# Altium footprint library Connectors THD.PcbLib: 631 footprints (part 1 of 46) (continued)
## 3M_2540-6002RB [mm] "40 Contacts - Straight .100\" x .100\" Low Profile Four-Wall Header"
height 10.03
pads (40):
  round 1.6 hole 1: 1(-24.13,-1.27) 2(-24.13,1.27) 3(-21.59,-1.27) 4(-21.59,1.27) 5(-19.05,-1.27) 6(-19.05,1.27) 7(-16.51,-1.27) 8(-16.51,1.27) 9(-13.97,-1.27) 10(-13.97,1.27) 11(-11.43,-1.27) 12(-11.43,1.27) 13(-8.89,-1.27) 14(-8.89,1.27) 15(-6.35,-1.27) 16(-6.35,1.27) 17(-3.81,-1.27) 18(-3.81,1.27) 19(-1.27,-1.27) 20(-1.27,1.27) 21(1.27,-1.27) 22(1.27,1.27) 23(3.81,-1.27) 24(3.81,1.27) 25(6.35,-1.27) 26(6.35,1.27) 27(8.89,-1.27) 28(8.89,1.27) 29(11.43,-1.27) 30(11.43,1.27) 31(13.97,-1.27) 32(13.97,1.27) 33(16.51,-1.27) 34(16.51,1.27) 35(19.05,-1.27) 36(19.05,1.27) 37(21.59,-1.27) 38(21.59,1.27) 39(24.13,-1.27) 40(24.13,1.27)
Top Overlay:
  circle w0.3: c-24.13,-4.699 r0.15
  lines w0.2: -28.042,-1.603 -25.629,-1.603 -25.629,1.603 -28.042,1.603 ; -28.042,-1.524 -28.346,-1.524 -28.346,1.524 -28.042,1.524 ; -24.994,-4.064 -24.13,-3.2 -23.266,-4.064 ; -23.178,3.15 -28.042,3.15 -28.042,-3.2 -3.366,-3.2 ; -23.178,4.064 -23.178,2.159 -22.469,2.159 ; -21.361,-3.835 -21.361,-3.2 ; -19.279,-3.835 -19.279,-3.2 ; -18.987,2.518 -18.987,4.064 ; -18.987,3.15 18.987,3.15 ; -3.366,-4.064 -3.366,-2.438 ; 0.826,-4.064 0.826,-2.438 ; 0.826,-3.2 28.042,-3.2 28.042,3.15 25.4,3.15 ; 18.987,2.518 18.987,4.064 ; 21.819,-3.835 21.819,-3.2 ; 22.469,2.159 23.178,2.159 23.178,4.064 ; 23.901,-3.835 23.901,-3.2 ; 28.042,-1.603 25.629,-1.603 25.629,1.603 28.042,1.603 ; 28.042,-1.524 28.346,-1.524 28.346,1.524 28.042,1.524 ; -29.058,-4.064 -29.058,4.064 -28.397,4.064 cw(c-27.94,4.064) -27.483,4.064 -1.727,4.064 cw(c-1.27,4.064) -0.813,4.064 27.483,4.064 cw(c27.94,4.064) 28.397,4.064 29.058,4.064 29.058,-4.064 24.892,-4.064 24.892,-3.835 20.828,-3.835 20.828,-4.064 -18.288,-4.064 -18.288,-3.835 -22.352,-3.835 -22.352,-4.064 -29.058,-4.064
  text "40" at 23.495,2.667 h1.02
Mechanical 14:
  lines w0.1: -28.042,-1.603 -25.629,-1.603 -25.629,1.603 -28.042,1.603 ; -28.042,-1.524 -28.346,-1.524 -28.346,1.524 -28.042,1.524 ; -24.994,-4.064 -24.13,-3.2 -23.266,-4.064 ; -23.178,3.15 -28.042,3.15 -28.042,-3.2 -3.366,-3.2 ; -23.178,4.064 -23.178,2.159 -18.987,2.159 -18.987,4.064 ; -21.361,-3.835 -21.361,-3.2 ; -19.279,-3.835 -19.279,-3.2 ; -18.987,3.15 18.987,3.15 ; -3.366,-4.064 -3.366,-2.159 0.826,-2.159 0.826,-4.064 ; 0.826,-3.2 28.042,-3.2 28.042,3.15 25.4,3.15 ; 18.987,4.064 18.987,2.159 23.178,2.159 23.178,4.064 ; 21.819,-3.835 21.819,-3.2 ; 23.901,-3.835 23.901,-3.2 ; 28.042,-1.603 25.629,-1.603 25.629,1.603 28.042,1.603 ; 28.042,-1.524 28.346,-1.524 28.346,1.524 28.042,1.524 ; -29.058,-4.064 -29.058,4.064 -28.397,4.064 cw(c-27.94,4.064) -27.483,4.064 -1.727,4.064 cw(c-1.27,4.064) -0.813,4.064 27.483,4.064 cw(c27.94,4.064) 28.397,4.064 29.058,4.064 29.058,-4.064 24.892,-4.064 24.892,-3.835 20.828,-3.835 20.828,-4.064 -18.288,-4.064 -18.288,-3.835 -22.352,-3.835 -22.352,-4.064 -29.058,-4.064
  text "40" at 23.495,2.667 h1.02
3D body: height 9.65, standoff -2.59, extent -29.058,-4.064 29.058,4.572

## 3M_2550-6002RB [mm] "50 Contacts - Straight .100\" x .100\" Low Profile Four-Wall Header"
height 10.03
pads (50):
  round 1.6 hole 1: 1(-30.48,-1.27) 2(-30.48,1.27) 3(-27.94,-1.27) 4(-27.94,1.27) 5(-25.4,-1.27) 6(-25.4,1.27) 7(-22.86,-1.27) 8(-22.86,1.27) 9(-20.32,-1.27) 10(-20.32,1.27) 11(-17.78,-1.27) 12(-17.78,1.27) 13(-15.24,-1.27) 14(-15.24,1.27) 15(-12.7,-1.27) 16(-12.7,1.27) 17(-10.16,-1.27) 18(-10.16,1.27) 19(-7.62,-1.27) 20(-7.62,1.27) 21(-5.08,-1.27) 22(-5.08,1.27) 23(-2.54,-1.27) 24(-2.54,1.27) 25(0,-1.27) 26(0,1.27) 27(2.54,-1.27) 28(2.54,1.27) 29(5.08,-1.27) 30(5.08,1.27) 31(7.62,-1.27) 32(7.62,1.27) 33(10.16,-1.27) 34(10.16,1.27) 35(12.7,-1.27) 36(12.7,1.27) 37(15.24,-1.27) 38(15.24,1.27) 39(17.78,-1.27) 40(17.78,1.27) 41(20.32,-1.27) 42(20.32,1.27) 43(22.86,-1.27) 44(22.86,1.27) 45(25.4,-1.27) 46(25.4,1.27) 47(27.94,-1.27) 48(27.94,1.27) 49(30.48,-1.27) 50(30.48,1.27)
Top Overlay:
  circle w0.3: c-30.48,-4.699 r0.15
  lines w0.2: -34.392,-1.603 -31.979,-1.603 -31.979,1.603 -34.392,1.603 ; -34.392,-1.524 -34.696,-1.524 -34.696,1.524 -34.392,1.524 ; -31.344,-4.064 -30.48,-3.2 -29.616,-4.064 ; -29.528,3.15 -34.392,3.15 -34.392,-3.2 -2.096,-3.2 ; -29.528,4.064 -29.528,2.159 -28.819,2.159 ; -27.711,-3.835 -27.711,-3.2 ; -25.629,-3.835 -25.629,-3.2 ; -25.337,2.518 -25.337,4.064 ; -25.337,3.15 25.337,3.15 ; -2.096,-4.064 -2.096,-2.438 ; 2.095,-4.064 2.095,-2.438 ; 2.095,-3.2 34.392,-3.2 34.392,3.15 31.75,3.15 ; 25.337,2.518 25.337,4.064 ; 28.169,-3.835 28.169,-3.2 ; 28.819,2.159 29.528,2.159 29.528,4.064 ; 30.251,-3.835 30.251,-3.2 ; 34.392,-1.603 31.979,-1.603 31.979,1.603 34.392,1.603 ; 34.392,-1.524 34.696,-1.524 34.696,1.524 34.392,1.524 ; -35.408,-4.064 -35.408,4.064 -34.747,4.064 cw(c-34.29,4.064) -33.833,4.064 -0.457,4.064 cw(c0,4.064) 0.457,4.064 33.833,4.064 cw(c34.29,4.064) 34.747,4.064 35.408,4.064 35.408,-4.064 31.242,-4.064 31.242,-3.835 27.178,-3.835 27.178,-4.064 -24.638,-4.064 -24.638,-3.835 -28.702,-3.835 -28.702,-4.064 -35.408,-4.064
  text "50" at 29.845,2.667 h1.02
Mechanical 14:
  lines w0.1: -34.392,-1.603 -31.979,-1.603 -31.979,1.603 -34.392,1.603 ; -34.392,-1.524 -34.696,-1.524 -34.696,1.524 -34.392,1.524 ; -31.344,-4.064 -30.48,-3.2 -29.616,-4.064 ; -29.528,3.15 -34.392,3.15 -34.392,-3.2 -2.096,-3.2 ; -29.528,4.064 -29.528,2.159 -25.337,2.159 -25.337,4.064 ; -27.711,-3.835 -27.711,-3.2 ; -25.629,-3.835 -25.629,-3.2 ; -25.337,3.15 25.337,3.15 ; -2.096,-4.064 -2.096,-2.159 2.095,-2.159 2.095,-4.064 ; 2.095,-3.2 34.392,-3.2 34.392,3.15 31.75,3.15 ; 25.337,4.064 25.337,2.159 29.528,2.159 29.528,4.064 ; 28.169,-3.835 28.169,-3.2 ; 30.251,-3.835 30.251,-3.2 ; 34.392,-1.603 31.979,-1.603 31.979,1.603 34.392,1.603 ; 34.392,-1.524 34.696,-1.524 34.696,1.524 34.392,1.524 ; -35.408,-4.064 -35.408,4.064 -34.747,4.064 cw(c-34.29,4.064) -33.833,4.064 -0.457,4.064 cw(c0,4.064) 0.457,4.064 33.833,4.064 cw(c34.29,4.064) 34.747,4.064 35.408,4.064 35.408,-4.064 31.242,-4.064 31.242,-3.835 27.178,-3.835 27.178,-4.064 -24.638,-4.064 -24.638,-3.835 -28.702,-3.835 -28.702,-4.064 -35.408,-4.064
  text "50" at 29.845,2.667 h1.02
3D body: height 9.65, standoff -2.59, extent -35.408,-4.064 35.408,4.572

## 3M_2560-6002RB [mm] "60 Contacts - Straight .100\" x .100\" Low Profile Four-Wall Header"
height 10.03
pads (60):
  round 1.6 hole 1: 1(-36.83,-1.27) 2(-36.83,1.27) 3(-34.29,-1.27) 4(-34.29,1.27) 5(-31.75,-1.27) 6(-31.75,1.27) 7(-29.21,-1.27) 8(-29.21,1.27) 9(-26.67,-1.27) 10(-26.67,1.27) 11(-24.13,-1.27) 12(-24.13,1.27) 13(-21.59,-1.27) 14(-21.59,1.27) 15(-19.05,-1.27) 16(-19.05,1.27) 17(-16.51,-1.27) 18(-16.51,1.27) 19(-13.97,-1.27) 20(-13.97,1.27) 21(-11.43,-1.27) 22(-11.43,1.27) 23(-8.89,-1.27) 24(-8.89,1.27) 25(-6.35,-1.27) 26(-6.35,1.27) 27(-3.81,-1.27) 28(-3.81,1.27) 29(-1.27,-1.27) 30(-1.27,1.27) 31(1.27,-1.27) 32(1.27,1.27) 33(3.81,-1.27) 34(3.81,1.27) 35(6.35,-1.27) 36(6.35,1.27) 37(8.89,-1.27) 38(8.89,1.27) 39(11.43,-1.27) 40(11.43,1.27) 41(13.97,-1.27) 42(13.97,1.27) 43(16.51,-1.27) 44(16.51,1.27) 45(19.05,-1.27) 46(19.05,1.27) 47(21.59,-1.27) 48(21.59,1.27) 49(24.13,-1.27) 50(24.13,1.27) 51(26.67,-1.27) 52(26.67,1.27) 53(29.21,-1.27) 54(29.21,1.27) 55(31.75,-1.27) 56(31.75,1.27) 57(34.29,-1.27) 58(34.29,1.27) 59(36.83,-1.27) 60(36.83,1.27)
Top Overlay:
  circle w0.3: c-36.83,-4.699 r0.15
  lines w0.2: -40.742,-1.603 -38.329,-1.603 -38.329,1.603 -40.742,1.603 ; -40.742,-1.524 -41.046,-1.524 -41.046,1.524 -40.742,1.524 ; -37.694,-4.064 -36.83,-3.2 -35.966,-4.064 ; -35.878,3.15 -40.742,3.15 -40.742,-3.2 -3.366,-3.2 ; -35.878,4.064 -35.878,2.159 -35.169,2.159 ; -34.061,-3.835 -34.061,-3.2 ; -31.979,-3.835 -31.979,-3.2 ; -31.687,2.518 -31.687,4.064 ; -31.687,3.15 31.687,3.15 ; -3.366,-4.064 -3.366,-2.438 ; 0.826,-4.064 0.826,-2.438 ; 0.826,-3.2 40.742,-3.2 40.742,3.15 38.1,3.15 ; 31.687,2.518 31.687,4.064 ; 34.519,-3.835 34.519,-3.2 ; 35.169,2.159 35.878,2.159 35.878,4.064 ; 36.601,-3.835 36.601,-3.2 ; 40.742,-1.603 38.329,-1.603 38.329,1.603 40.742,1.603 ; 40.742,-1.524 41.046,-1.524 41.046,1.524 40.742,1.524 ; -41.758,-4.064 -35.052,-4.064 -35.052,-3.835 -30.988,-3.835 -30.988,-4.064 33.528,-4.064 33.528,-3.835 37.592,-3.835 37.592,-4.064 41.758,-4.064 41.758,4.064 41.097,4.064 ccw(c40.64,4.064) 40.183,4.064 -0.813,4.064 ccw(c-1.27,4.064) -1.727,4.064 -40.183,4.064 ccw(c-40.64,4.064) -41.097,4.064 -41.758,4.064 -41.758,-4.064
  text "60" at 36.195,2.667 h1.02
Mechanical 14:
  lines w0.1: -40.742,-1.603 -38.329,-1.603 -38.329,1.603 -40.742,1.603 ; -40.742,-1.524 -41.046,-1.524 -41.046,1.524 -40.742,1.524 ; -37.694,-4.064 -36.83,-3.2 -35.966,-4.064 ; -35.878,3.15 -40.742,3.15 -40.742,-3.2 -3.366,-3.2 ; -35.878,4.064 -35.878,2.159 -31.687,2.159 -31.687,4.064 ; -34.061,-3.835 -34.061,-3.2 ; -31.979,-3.835 -31.979,-3.2 ; -31.687,3.15 31.687,3.15 ; -3.366,-4.064 -3.366,-2.159 0.826,-2.159 0.826,-4.064 ; 0.826,-3.2 40.742,-3.2 40.742,3.15 38.1,3.15 ; 31.687,4.064 31.687,2.159 35.878,2.159 35.878,4.064 ; 34.519,-3.835 34.519,-3.2 ; 36.601,-3.835 36.601,-3.2 ; 40.742,-1.603 38.329,-1.603 38.329,1.603 40.742,1.603 ; 40.742,-1.524 41.046,-1.524 41.046,1.524 40.742,1.524 ; -41.758,-4.064 -35.052,-4.064 -35.052,-3.835 -30.988,-3.835 -30.988,-4.064 33.528,-4.064 33.528,-3.835 37.592,-3.835 37.592,-4.064 41.758,-4.064 41.758,4.064 41.097,4.064 ccw(c40.64,4.064) 40.183,4.064 -0.813,4.064 ccw(c-1.27,4.064) -1.727,4.064 -40.183,4.064 ccw(c-40.64,4.064) -41.097,4.064 -41.758,4.064 -41.758,-4.064
  text "60" at 36.195,2.667 h1.02
3D body: height 9.65, standoff -2.59, extent -41.758,-4.064 41.758,4.572

## 3M_2564-6002RB [mm] "64 Contacts - Straight .100\" x .100\" Low Profile Four-Wall Header"
height 10.03
pads (64):
  round 1.6 hole 1: 1(-39.37,-1.27) 2(-39.37,1.27) 3(-36.83,-1.27) 4(-36.83,1.27) 5(-34.29,-1.27) 6(-34.29,1.27) 7(-31.75,-1.27) 8(-31.75,1.27) 9(-29.21,-1.27) 10(-29.21,1.27) 11(-26.67,-1.27) 12(-26.67,1.27) 13(-24.13,-1.27) 14(-24.13,1.27) 15(-21.59,-1.27) 16(-21.59,1.27) 17(-19.05,-1.27) 18(-19.05,1.27) 19(-16.51,-1.27) 20(-16.51,1.27) 21(-13.97,-1.27) 22(-13.97,1.27) 23(-11.43,-1.27) 24(-11.43,1.27) 25(-8.89,-1.27) 26(-8.89,1.27) 27(-6.35,-1.27) 28(-6.35,1.27) 29(-3.81,-1.27) 30(-3.81,1.27) 31(-1.27,-1.27) 32(-1.27,1.27) 33(1.27,-1.27) 34(1.27,1.27) 35(3.81,-1.27) 36(3.81,1.27) 37(6.35,-1.27) 38(6.35,1.27) 39(8.89,-1.27) 40(8.89,1.27) 41(11.43,-1.27) 42(11.43,1.27) 43(13.97,-1.27) 44(13.97,1.27) 45(16.51,-1.27) 46(16.51,1.27) 47(19.05,-1.27) 48(19.05,1.27) 49(21.59,-1.27) 50(21.59,1.27) 51(24.13,-1.27) 52(24.13,1.27) 53(26.67,-1.27) 54(26.67,1.27) 55(29.21,-1.27) 56(29.21,1.27) 57(31.75,-1.27) 58(31.75,1.27) 59(34.29,-1.27) 60(34.29,1.27) 61(36.83,-1.27) 62(36.83,1.27) 63(39.37,-1.27) 64(39.37,1.27)
Top Overlay:
  circle w0.3: c-39.37,-4.699 r0.15
  lines w0.2: -43.282,-1.603 -40.869,-1.603 -40.869,1.603 -43.282,1.603 ; -43.282,-1.524 -43.586,-1.524 -43.586,1.524 -43.282,1.524 ; -40.234,-4.064 -39.37,-3.2 -38.506,-4.064 ; -38.418,3.15 -43.282,3.15 -43.282,-3.2 -3.366,-3.2 ; -38.418,4.064 -38.418,2.159 -37.709,2.159 ; -36.601,-3.835 -36.601,-3.2 ; -34.519,-3.835 -34.519,-3.2 ; -34.227,2.518 -34.227,4.064 ; -34.227,3.15 34.227,3.15 ; -3.366,-4.064 -3.366,-2.438 ; 0.826,-4.064 0.826,-2.438 ; 0.826,-3.2 43.282,-3.2 43.282,3.15 40.64,3.15 ; 34.227,2.518 34.227,4.064 ; 37.059,-3.835 37.059,-3.2 ; 37.709,2.159 38.418,2.159 38.418,4.064 ; 39.141,-3.835 39.141,-3.2 ; 43.282,-1.603 40.869,-1.603 40.869,1.603 43.282,1.603 ; 43.282,-1.524 43.586,-1.524 43.586,1.524 43.282,1.524 ; -44.298,-4.064 -44.298,4.064 -43.637,4.064 cw(c-43.18,4.064) -42.723,4.064 -1.727,4.064 cw(c-1.27,4.064) -0.813,4.064 42.723,4.064 cw(c43.18,4.064) 43.637,4.064 44.298,4.064 44.298,-4.064 40.132,-4.064 40.132,-3.835 36.068,-3.835 36.068,-4.064 -33.528,-4.064 -33.528,-3.835 -37.592,-3.835 -37.592,-4.064 -44.298,-4.064
  text "64" at 38.735,2.667 h1.02
Mechanical 14:
  lines w0.1: -43.282,-1.603 -40.869,-1.603 -40.869,1.603 -43.282,1.603 ; -43.282,-1.524 -43.586,-1.524 -43.586,1.524 -43.282,1.524 ; -40.234,-4.064 -39.37,-3.2 -38.506,-4.064 ; -38.418,3.15 -43.282,3.15 -43.282,-3.2 -3.366,-3.2 ; -38.418,4.064 -38.418,2.159 -34.227,2.159 -34.227,4.064 ; -36.601,-3.835 -36.601,-3.2 ; -34.519,-3.835 -34.519,-3.2 ; -34.227,3.15 34.227,3.15 ; -3.366,-4.064 -3.366,-2.159 0.826,-2.159 0.826,-4.064 ; 0.826,-3.2 43.282,-3.2 43.282,3.15 40.64,3.15 ; 34.227,4.064 34.227,2.159 38.418,2.159 38.418,4.064 ; 37.059,-3.835 37.059,-3.2 ; 39.141,-3.835 39.141,-3.2 ; 43.282,-1.603 40.869,-1.603 40.869,1.603 43.282,1.603 ; 43.282,-1.524 43.586,-1.524 43.586,1.524 43.282,1.524 ; -44.298,-4.064 -44.298,4.064 -43.637,4.064 cw(c-43.18,4.064) -42.723,4.064 -1.727,4.064 cw(c-1.27,4.064) -0.813,4.064 42.723,4.064 cw(c43.18,4.064) 43.637,4.064 44.298,4.064 44.298,-4.064 40.132,-4.064 40.132,-3.835 36.068,-3.835 36.068,-4.064 -33.528,-4.064 -33.528,-3.835 -37.592,-3.835 -37.592,-4.064 -44.298,-4.064
  text "64" at 38.735,2.667 h1.02
3D body: height 9.65, standoff -2.59, extent -44.298,-4.064 44.298,4.572

## 3M_3429-5202 [mm] "3M, 3000 Series, 26 Contacts - Pitch 2.54mm - Right Angle Four-Wall Header (Grey) With Short Roll Pin Latch/Ejectors"
height 8.6
pads (28):
  round 1.6 hole 0.9: 1(-15.24,-1.27) 2(-15.24,1.27) 3(-12.7,-1.27) 4(-12.7,1.27) 5(-10.16,-1.27) 6(-10.16,1.27) 7(-7.62,-1.27) 8(-7.62,1.27) 9(-5.08,-1.27) 10(-5.08,1.27) 11(-2.54,-1.27) 12(-2.54,1.27) 13(0,-1.27) 14(0,1.27) 15(2.54,-1.27) 16(2.54,1.27) 17(5.08,-1.27) 18(5.08,1.27) 19(7.62,-1.27) 20(7.62,1.27) 21(10.16,-1.27) 22(10.16,1.27) 23(12.7,-1.27) 24(12.7,1.27) 25(15.24,-1.27) 26(15.24,1.27)
  round 4.6 hole 2.8: MTG1(-21.146,0.533) MTG2(21.146,0.533)
Top Overlay:
  circle w0.3: c-15.313,-3.048 r0.15
  lines w0.2: -29.561,9.892 -26.983,14.358 ccw(c-27.071,14.409) -27.02,14.497 -29.935,16.179 -35.04,13.232 ccw(c-34.989,13.144) -35.04,13.056 -28.051,9.02 -25.74,6.266 ; -27.948,12.686 -24.192,10.517 ; -24.702,-2.009 -26.162,-2.007 -26.162,5.105 -22.834,14.249 -21.992,14.249 ccw(c-20.828,14.757) -19.558,14.756 -18.716,14.757 -18.274,12.251 ccw(c-17.023,12.471) -17.023,11.201 17.023,11.201 ccw(c17.023,12.471) 18.274,12.251 18.716,14.757 19.558,14.757 ccw(c20.828,14.757) 21.992,14.249 22.834,14.249 26.162,5.105 26.162,-2.007 24.702,-2.007 cw(c24.194,-2.007) 23.686,-2.007 16,-2.007 ; -24.702,-2.007 ccw(c-24.194,-2.007) -23.686,-2.007 -16,-2.007 ; -22.149,14.249 -22.149,22.024 cw(c-22.047,22.024) -21.996,22.112 -16.891,19.164 -16.891,15.799 cw(c-16.993,15.799) -16.993,15.697 -22.149,15.697 ; -18.923,14.757 -18.923,15.697 ; -16.478,11.201 -15.208,9.002 -14.671,9.931 ; -14.929,11.201 -14.929,9.931 -13.011,9.931 -13.011,11.201 ; -6.858,-2.007 ccw(c-6.35,-2.007) -5.842,-2.007 ; -2.032,11.201 -2.032,3.581 2.032,3.581 2.032,11.201 ; 5.842,-2.007 ccw(c6.35,-2.007) 6.858,-2.007 ; 18.923,14.757 18.923,15.697 ; 22.149,14.249 22.149,22.024 ccw(c22.047,22.024) 21.996,22.112 16.891,19.164 16.891,15.799 ccw(c16.993,15.799) 16.993,15.697 22.149,15.697 ; 24.192,10.517 27.948,12.686 ; 25.74,6.266 28.051,9.02 35.04,13.056 ccw(c34.989,13.144) 35.04,13.232 29.935,16.179 27.02,14.497 ccw(c27.071,14.409) 26.983,14.358 29.561,9.892
  text "1" at -17.272,-1.7 h1.02
  text "26" at 16.5,0.889 h1.02
Mechanical 8:
  circle w0.05: c15.24,1.27 r0.5
  circle w0.05: c12.7,1.27 r0.5
  circle w0.05: c10.16,1.27 r0.5
  circle w0.05: c7.62,1.27 r0.5
  circle w0.05: c5.08,1.27 r0.5
  circle w0.05: c2.54,1.27 r0.5
  circle w0.05: c0,1.27 r0.5
  circle w0.05: c-2.54,1.27 r0.5
  circle w0.05: c-5.08,1.27 r0.5
  circle w0.05: c-7.62,1.27 r0.5
  circle w0.05: c-10.16,1.27 r0.5
  circle w0.05: c-12.7,1.27 r0.5
  circle w0.05: c-15.24,1.27 r0.5
  circle w0.05: c-15.24,-1.27 r0.5
  circle w0.05: c-12.7,-1.27 r0.5
  circle w0.05: c-10.16,-1.27 r0.5
  circle w0.05: c-7.62,-1.27 r0.5
  circle w0.05: c-5.08,-1.27 r0.5
  circle w0.05: c-2.54,-1.27 r0.5
  circle w0.05: c0,-1.27 r0.5
  circle w0.05: c2.54,-1.27 r0.5
  circle w0.05: c5.08,-1.27 r0.5
  circle w0.05: c7.62,-1.27 r0.5
  circle w0.05: c10.16,-1.27 r0.5
  circle w0.05: c12.7,-1.27 r0.5
  circle w0.05: c15.24,-1.27 r0.5
  circle w0.1: c21.146,0.533 r1.3
  circle w0.05: c-21.146,0.533 r1.3
  lines w0.05: -1,0 0,0 0,-1
Mechanical 14:
  lines w0.1: -29.561,9.892 -26.983,14.358 ccw(c-27.071,14.409) -27.02,14.497 -29.935,16.179 -35.04,13.232 ccw(c-34.989,13.144) -35.04,13.056 -28.051,9.02 -25.74,6.266 ; -27.948,12.686 -24.192,10.517 ; -24.702,-2.009 -26.162,-2.007 -26.162,5.105 -22.834,14.249 -21.992,14.249 ccw(c-20.828,14.757) -19.558,14.756 -18.716,14.757 -18.274,12.251 ccw(c-17.023,12.471) -17.023,11.201 17.023,11.201 ccw(c17.023,12.471) 18.274,12.251 18.716,14.757 19.558,14.757 ccw(c20.828,14.757) 21.992,14.249 22.834,14.249 26.162,5.105 26.162,-2.007 24.702,-2.007 cw(c24.194,-2.007) 23.686,-2.007 6.858,-2.007 cw(c6.35,-2.007) 5.842,-2.007 -5.842,-2.007 cw(c-6.35,-2.007) -6.858,-2.007 -23.686,-2.007 cw(c-24.194,-2.007) -24.702,-2.007 ; -23.647,-2.007 -23.647,1.978 -21.146,3.422 -18.644,1.978 -18.644,-2.007 ; -23.28,-2.007 -23.043,0.699 cw(c-21.146,0.533) -19.248,0.699 -19.011,-2.007 ; -22.149,14.249 -22.149,22.024 cw(c-22.047,22.024) -21.996,22.112 -16.891,19.164 -16.891,15.799 cw(c-16.993,15.799) -16.993,15.697 -22.149,15.697 ; -18.923,14.757 -18.923,15.697 ; -16.478,11.201 -15.208,9.002 -14.671,9.931 ; -14.929,11.201 -14.929,9.931 -13.011,9.931 -13.011,11.201 ; -2.032,11.201 -2.032,3.581 2.032,3.581 2.032,11.201 ; 18.644,-2.007 18.644,1.978 21.146,3.422 23.647,1.978 23.647,-2.007 ; 18.923,14.757 18.923,15.697 ; 19.011,-2.007 19.248,0.699 cw(c21.146,0.533) 23.043,0.699 23.28,-2.007 ; 22.149,14.249 22.149,22.024 ccw(c22.047,22.024) 21.996,22.112 16.891,19.164 16.891,15.799 ccw(c16.993,15.799) 16.993,15.697 22.149,15.697 ; 24.192,10.517 27.948,12.686 ; 25.74,6.266 28.051,9.02 35.04,13.056 ccw(c34.989,13.144) 35.04,13.232 29.935,16.179 27.02,14.497 ccw(c27.071,14.409) 26.983,14.358 29.561,9.892
  text "1" at -17.272,-1.7 h1.02
  text "26" at 16.5,0.889 h1.02
3D body: height 8.64, standoff -3.94, extent -35.091,-2.513 35.091,16.181

## 3M_3429-5302 [mm] "3M, 3000 Series, 26 Contacts - Pitch 2.54mm - Right Angle Four-Wall Header (Grey) With Long Roll Pin Latch/Ejectors"
height 8.6
pads (28):
  round 1.6 hole 0.9: 1(-15.24,-1.27) 2(-15.24,1.27) 3(-12.7,-1.27) 4(-12.7,1.27) 5(-10.16,-1.27) 6(-10.16,1.27) 7(-7.62,-1.27) 8(-7.62,1.27) 9(-5.08,-1.27) 10(-5.08,1.27) 11(-2.54,-1.27) 12(-2.54,1.27) 13(0,-1.27) 14(0,1.27) 15(2.54,-1.27) 16(2.54,1.27) 17(5.08,-1.27) 18(5.08,1.27) 19(7.62,-1.27) 20(7.62,1.27) 21(10.16,-1.27) 22(10.16,1.27) 23(12.7,-1.27) 24(12.7,1.27) 25(15.24,-1.27) 26(15.24,1.27)
  round 4.6 hole 2.8: MTG1(-21.146,0.533) MTG2(21.146,0.533)
Top Overlay:
  circle w0.3: c-15.313,-3.048 r0.15
  lines w0.2: -31.759,11.161 -29.181,15.627 ccw(c-29.269,15.677) -29.218,15.765 -32.132,17.448 -37.238,14.5 ccw(c-37.187,14.412) -37.238,14.324 -28.051,9.02 -25.74,6.266 ; -30.146,13.955 -24.192,10.517 ; -23.686,-2.007 cw(c-24.194,-2.007) -24.702,-2.007 -26.162,-2.007 -26.162,5.105 -22.834,14.249 -21.992,14.249 ccw(c-20.828,14.757) -19.558,14.756 -18.716,14.757 -18.274,12.251 ccw(c-17.023,12.471) -17.023,11.201 17.023,11.201 ccw(c17.023,12.471) 18.274,12.251 18.716,14.757 19.558,14.757 ccw(c20.828,14.757) 21.992,14.249 22.834,14.249 26.162,5.105 26.162,-2.007 24.702,-2.007 cw(c24.194,-2.007) 23.686,-2.007 ; -22.149,14.249 -22.149,24.561 cw(c-22.047,24.561) -21.996,24.649 -16.891,21.702 -16.891,18.336 cw(c-16.993,18.336) -16.993,18.235 -22.149,18.235 ; -18.923,14.757 -18.923,18.235 ; -16.478,11.201 -15.208,9.002 -14.671,9.931 ; -14.929,11.201 -14.929,9.931 -13.011,9.931 -13.011,11.201 ; -6.858,-2.007 ccw(c-6.35,-2.007) -5.842,-2.007 ; -2.032,11.201 -2.032,3.581 2.032,3.581 2.032,11.201 ; 5.842,-2.007 ccw(c6.35,-2.007) 6.858,-2.007 ; 18.923,14.757 18.923,18.235 ; 22.149,14.249 22.149,24.561 ccw(c22.047,24.561) 21.996,24.649 16.891,21.702 16.891,18.336 ccw(c16.993,18.336) 16.993,18.235 22.149,18.235 ; 24.192,10.517 30.146,13.955 ; 25.74,6.266 28.051,9.02 37.238,14.324 ccw(c37.187,14.412) 37.238,14.5 32.132,17.448 29.218,15.765 ccw(c29.269,15.677) 29.181,15.627 31.759,11.161
  text "26" at 16.5,0.889 h1.02
  text "1" at -17.272,-1.7 h1.02
Mechanical 8:
  circle w0.05: c15.24,1.27 r0.5
  circle w0.05: c12.7,1.27 r0.5
  circle w0.05: c10.16,1.27 r0.5
  circle w0.05: c7.62,1.27 r0.5
  circle w0.05: c5.08,1.27 r0.5
  circle w0.05: c2.54,1.27 r0.5
  circle w0.05: c0,1.27 r0.5
  circle w0.05: c-2.54,1.27 r0.5
  circle w0.05: c-5.08,1.27 r0.5
  circle w0.05: c-7.62,1.27 r0.5
  circle w0.05: c-10.16,1.27 r0.5
  circle w0.05: c-12.7,1.27 r0.5
  circle w0.05: c-15.24,1.27 r0.5
  circle w0.05: c-15.24,-1.27 r0.5
  circle w0.05: c-12.7,-1.27 r0.5
  circle w0.05: c-10.16,-1.27 r0.5
  circle w0.05: c-7.62,-1.27 r0.5
  circle w0.05: c-5.08,-1.27 r0.5
  circle w0.05: c-2.54,-1.27 r0.5
  circle w0.05: c0,-1.27 r0.5
  circle w0.05: c2.54,-1.27 r0.5
  circle w0.05: c5.08,-1.27 r0.5
  circle w0.05: c7.62,-1.27 r0.5
  circle w0.05: c10.16,-1.27 r0.5
  circle w0.05: c12.7,-1.27 r0.5
  circle w0.05: c15.24,-1.27 r0.5
  circle w0.1: c21.146,0.533 r1.3
  circle w0.05: c-21.146,0.533 r1.3
  lines w0.05: 0,0 0,-1 0,0 ; 0,0 -1,0 0,0
Mechanical 14:
  lines w0.1: -31.759,11.161 -29.181,15.627 ccw(c-29.269,15.677) -29.218,15.765 -32.132,17.448 -37.238,14.5 ccw(c-37.187,14.412) -37.238,14.324 -28.051,9.02 -25.74,6.266 ; -30.146,13.955 -24.192,10.517 ; -23.647,-2.007 -23.647,1.978 -21.146,3.422 -18.644,1.978 -18.644,-2.007 ; -23.28,-2.007 -23.043,0.699 cw(c-21.146,0.533) -19.248,0.699 -19.011,-2.007 ; -22.149,14.249 -22.149,24.561 cw(c-22.047,24.561) -21.996,24.649 -16.891,21.702 -16.891,18.336 cw(c-16.993,18.336) -16.993,18.235 -22.149,18.235 ; -18.923,14.757 -18.923,18.235 ; -16.478,11.201 -15.208,9.002 -14.671,9.931 ; -14.929,11.201 -14.929,9.931 -13.011,9.931 -13.011,11.201 ; -2.032,11.201 -2.032,3.581 2.032,3.581 2.032,11.201 ; 18.644,-2.007 18.644,1.978 21.146,3.422 23.647,1.978 23.647,-2.007 ; 18.923,14.757 18.923,18.235 ; 19.011,-2.007 19.248,0.699 cw(c21.146,0.533) 23.043,0.699 23.28,-2.007 ; 22.149,14.249 22.149,24.561 ccw(c22.047,24.561) 21.996,24.649 16.891,21.702 16.891,18.336 ccw(c16.993,18.336) 16.993,18.235 22.149,18.235 ; 24.192,10.517 30.146,13.955 ; 25.74,6.266 28.051,9.02 37.238,14.324 ccw(c37.187,14.412) 37.238,14.5 32.132,17.448 29.218,15.765 ccw(c29.269,15.677) 29.181,15.627 31.759,11.161 ; -26.162,-2.007 -24.702,-2.007 ccw(c-24.194,-2.007) -23.686,-2.007 -6.858,-2.007 ccw(c-6.35,-2.007) -5.842,-2.007 5.842,-2.007 ccw(c6.35,-2.007) 6.858,-2.007 23.686,-2.007 ccw(c24.194,-2.007) 24.702,-2.007 26.162,-2.007 26.162,5.105 22.834,14.249 21.992,14.249 cw(c20.828,14.757) 19.558,14.757 18.716,14.757 18.274,12.251 cw(c17.023,12.471) 17.023,11.201 -17.023,11.201 cw(c-17.023,12.471) -18.274,12.251 -18.716,14.757 -19.558,14.756 cw(c-20.828,14.757) -21.992,14.249 -22.834,14.249 -26.162,5.105 -26.162,-2.007
  text "26" at 16.5,0.889 h1.02
  text "1" at -17.272,-1.7 h1.02
3D body: height 8.64, standoff -3.94, extent -37.288,-2.513 37.289,17.45

## 3M_5120-B7A2PL [mm] "20 Contacts - Right Angle .100\" x .100\" Polarized Boardmount Socket, 5100 Series"
height 8.4
pads (22):
  round 1.6 hole 0.9: 1(11.43,0) 2(11.43,2.54) 3(8.89,0) 4(8.89,2.54) 5(6.35,0) 6(6.35,2.54) 7(3.81,0) 8(3.81,2.54) 9(1.27,0) 10(1.27,2.54) 11(-1.27,0) 12(-1.27,2.54) 13(-3.81,0) 14(-3.81,2.54) 15(-6.35,0) 16(-6.35,2.54) 17(-8.89,0) 18(-8.89,2.54) 19(-11.43,0) 20(-11.43,2.54)
  round 5.5 hole 2.6: 21(-16.5,2.54) 22(16.5,2.54)
Top Overlay:
  circle w0.3: c11.43,-1.486 r0.15
  lines w0.2: -19.05,0.691 -19.05,-0.76 -12.359,-0.76 ; -19.05,4.389 -19.05,6.24 -1.7,6.24 ; -19.05,5.04 -18.416,5.04 ; -15,6.24 -15,13.84 15,13.84 15,6.24 ; -14.584,5.04 -1.7,5.04 ; -14,-0.76 -14,0.624 ; -13.513,3.54 -12.093,3.54 ; -1.7,3.54 -1.7,13.84 ; 1.7,3.54 1.7,13.84 ; 1.7,5.04 14.584,5.04 ; 1.7,6.24 19.05,6.24 19.05,4.389 ; 12.093,3.54 13.513,3.54 ; 12.359,-0.76 19.05,-0.76 19.05,0.691 ; 14,-0.76 14,0.624 ; 18.416,5.04 19.05,5.04
  text "1" at 12.835,-0.142 h1.02
Mechanical 8:
  lines w0.1: -17,2.54 -16.5,2.54 ; -16.5,2.04 -16.5,2.54 ; -16.5,3.04 -16.5,2.54 ; -16,2.54 -16.5,2.54 ; -11.93,0 -11.43,0 ; -11.93,2.54 -11.43,2.54 ; -11.43,-0.5 -11.43,0 ; -11.43,0.5 -11.43,0 ; -11.43,2.04 -11.43,2.54 ; -11.43,3.04 -11.43,2.54 ; -10.93,0 -11.43,0 ; -10.93,2.54 -11.43,2.54 ; -9.39,0 -8.89,0 ; -9.39,2.54 -8.89,2.54 ; -8.89,-0.5 -8.89,0 ; -8.89,0.5 -8.89,0 ; -8.89,2.04 -8.89,2.54 ; -8.89,3.04 -8.89,2.54 ; -8.39,0 -8.89,0 ; -8.39,2.54 -8.89,2.54 ; -6.85,0 -6.35,0 ; -6.85,2.54 -6.35,2.54 ; -6.35,-0.5 -6.35,0 ; -6.35,0.5 -6.35,0 ; -6.35,2.04 -6.35,2.54 ; -6.35,3.04 -6.35,2.54 ; -5.85,0 -6.35,0 ; -5.85,2.54 -6.35,2.54 ; -4.31,0 -3.81,0 ; -4.31,2.54 -3.81,2.54 ; -3.81,-0.5 -3.81,0 ; -3.81,0.5 -3.81,0 ; -3.81,2.04 -3.81,2.54 ; -3.81,3.04 -3.81,2.54 ; -3.31,0 -3.81,0 ; -3.31,2.54 -3.81,2.54 ; -1.77,0 -1.27,0 ; -1.77,2.54 -1.27,2.54 ; -1.27,-0.5 -1.27,0 ; -1.27,0.5 -1.27,0 ; -1.27,2.04 -1.27,2.54 ; -1.27,3.04 -1.27,2.54 ; -0.77,0 -1.27,0 ; -0.77,2.54 -1.27,2.54 ; -0.5,0 0,0 ; 0,-0.5 0,0 ; 0,0.5 0,0 ; 0.5,0 0,0 ; 0.77,0 1.27,0 ; 0.77,2.54 1.27,2.54 ; 1.27,-0.5 1.27,0 ; 1.27,0.5 1.27,0 ; 1.27,2.04 1.27,2.54 ; 1.27,3.04 1.27,2.54 ; 1.77,0 1.27,0 ; 1.77,2.54 1.27,2.54 ; 3.31,0 3.81,0 ; 3.31,2.54 3.81,2.54 ; 3.81,-0.5 3.81,0 ; 3.81,0.5 3.81,0 ; 3.81,2.04 3.81,2.54 ; 3.81,3.04 3.81,2.54 ; 4.31,0 3.81,0 ; 4.31,2.54 3.81,2.54 ; 5.85,0 6.35,0 ; 5.85,2.54 6.35,2.54 ; 6.35,-0.5 6.35,0 ; 6.35,0.5 6.35,0 ; 6.35,2.04 6.35,2.54 ; 6.35,3.04 6.35,2.54 ; 6.85,0 6.35,0 ; 6.85,2.54 6.35,2.54 ; 8.39,0 8.89,0 ; 8.39,2.54 8.89,2.54 ; 8.89,-0.5 8.89,0 ; 8.89,0.5 8.89,0 ; 8.89,2.04 8.89,2.54 ; 8.89,3.04 8.89,2.54 ; 9.39,0 8.89,0 ; 9.39,2.54 8.89,2.54 ; 10.93,0 11.43,0 ; 10.93,2.54 11.43,2.54 ; 11.43,-0.5 11.43,0 ; 11.43,0.5 11.43,0 ; 11.43,2.04 11.43,2.54 ; 11.43,3.04 11.43,2.54 ; 11.93,0 11.43,0 ; 11.93,2.54 11.43,2.54 ; 16,2.54 16.5,2.54 ; 16.5,2.04 16.5,2.54 ; 16.5,3.04 16.5,2.54 ; 17,2.54 16.5,2.54
Mechanical 14:
  circle w0.3: c11.43,-1.486 r0.15
  lines w0.1: -19.05,5.04 -1.7,5.04 ; -17.77,5.04 -17.77,2.54 ccw(c-16.5,2.54) -15.23,2.54 -15.23,5.016 ; -15.5,5.04 cw(c-15.5,3.54) -14,3.54 ; -15,6.24 -15,13.84 15,13.84 15,6.24 ; -14,-0.76 -14,3.54 ; -1.7,3.54 -1.7,13.84 ; -1.7,6.24 -19.05,6.24 -19.05,-0.76 19.05,-0.76 19.05,6.24 1.7,6.24 ; 1.7,3.54 1.7,13.84 ; 1.7,5.04 19.05,5.04 ; 14,-0.76 14,3.54 ; 15.23,5.016 15.23,2.54 ccw(c16.5,2.54) 17.77,2.54 17.77,5.04 ; 15.5,5.04 ccw(c15.5,3.54) 14,3.54 ; -14,3.54 14,3.54
  text "1" at 12.835,-0.142 h1.02
3D body: height 8.4, standoff -2.6, extent -19.05,-0.76 19.05,13.84